# Altium footprint library Custom2.PcbLib: 99 footprints (part 2 of 7)
Each footprint in its own frame and in the unit in brackets; x right, y up, seen from the top. Pads: shape width x height; smd on the part's side, far side on the other; paste and mask are expansions set on the pad; w line width, h text height; cw(c..) or ccw(c..) is an arc to the next point about the centre after c.
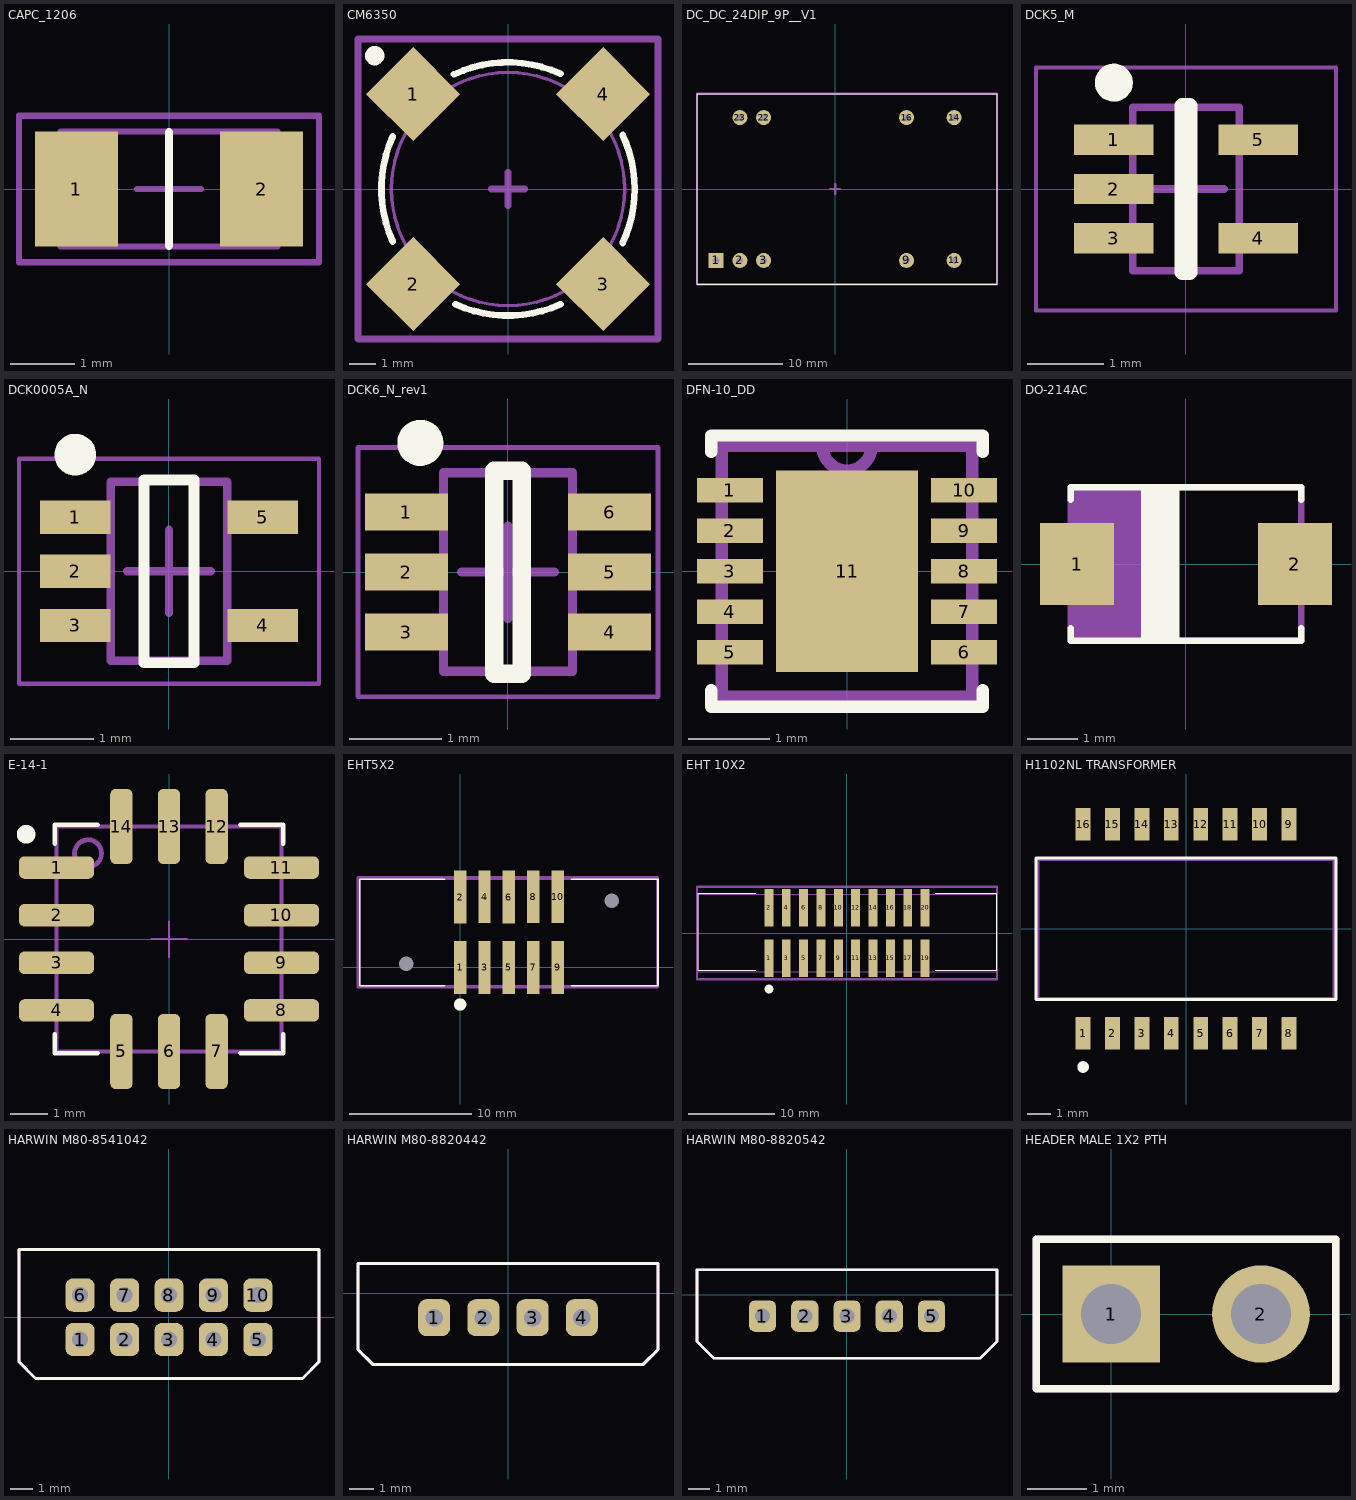
[diagram p1: the footprints below, top view; thin cyan lines are the x and y axes]

## CAPC_1206 [mm]
pads (2):
  rect 1.3x1.8 smd: 1(-1.45,0) 2(1.45,0)
Top Overlay:
  lines w0.127: 0,-0.889 0,0.889
Mechanical 13:
  lines w0.1: -1.7,-0.9 -1.7,0.9 1.7,0.9 1.7,-0.9 -1.7,-0.9
  text "'.Designator'" at -1.43,-0.602 h0.76
Mechanical 15:
  lines w0.1: -0.5,0 0.5,0 ; 0,-0.5 0,0.5 ; -2.35,-1.15 -2.35,1.15 2.35,1.15 2.35,-1.15 -2.35,-1.15
3D body: height 1.35, standoff 0, extent -1.7,-0.9 1.7,0.9

## CM6350 [mil]
pads (4):
  rect 100x100 smd rot 45 paste-4: 1(-142.5,142.5) 2(-142.5,-142.5) 3(142.5,-142.5) 4(142.5,142.5)
Top Overlay:
  circle w15: c-200,200 r7.07
  lines w10: -172.8,-78.99 cw(c0,0) -172.8,78.99 ; -80.9,171.92 cw(c0,0) 78.99,172.8 ; -78.99,-172.8 ccw(c0,0) 78.99,-172.8 ; 171.92,-80.9 ccw(c0,0) 171.92,80.9
Mechanical 13:
  circle w5: c0,0 r175
  circle w5: c-155,150 r10
  text "'.Designator'" at -55.34,-8.39 h30
Mechanical 15:
  lines w10: -25,0 25,0 ; 0,-25 0,25 ; -225,-225 -225,225 225,225 225,-225 -225,-225
3D body: height 204, standoff 4, extent -177.95,-174.86 172.05,174.88

## DC_DC_24DIP_9P__V1 [mm]
pads (9):
  rect 1.6x1.6 hole 0.711 paste-127 mask+0.05: 1(-12.7,-7.62)
  round 1.6 hole 0.711 paste-127 mask+0.05: 2(-10.16,-7.62) 3(-7.62,-7.62) 9(7.62,-7.62) 11(12.7,-7.62) 14(12.7,7.62) 16(7.62,7.62) 22(-7.62,7.62) 23(-10.16,7.62)
Top Overlay:
  lines w0.127: -14.73,-10.15 -14.73,10.16 17.27,10.16 17.27,-10.15 -14.73,-10.15
Mechanical 13:
  lines w0.15: -14.73,-10.15 -14.73,10.15 17.27,10.15 17.27,-10.15 -14.73,-10.15
  text "'.Designator'" at -3.175,-0.635 h0.76
Mechanical 15:
  lines w0.254: -0.508,0 0.508,0 ; 0,-0.508 0,0.508 ; -14.732,-10.16 -14.732,10.16 17.272,10.16 17.272,-10.16 -14.732,-10.16
3D body "ten8wi.stp": height 10.11, standoff -3.79, extent -14.7,-10.15 17.1,10.15

## DCK5_M [mm] "SOT23, 6-Leads, Body 2x1.3mm, Pitch 0.65mm, Lead Span 2.1mm, IPC Low Density"
height 1.1
pads (5):
  rect 1.05x0.4 smd: 1(-0.95,0.65) 2(-0.95,0) 3(-0.95,-0.65) 4(0.95,-0.65) 5(0.95,0.65)
Top Overlay:
  circle w0.25: c-0.95,1.4 r0.125
  lines w0.2: -0.05,-1.1 -0.05,1.1 0.05,1.1 0.05,-1.1 -0.05,-1.1
Mechanical 13:
  lines w0.1: -0.7,-1.075 0.7,-1.075 0.7,1.075 -0.7,1.075 -0.7,-1.075
Mechanical 15:
  lines w0.05: -1.975,-1.6 1.975,-1.6 1.975,1.6 -1.975,1.6 -1.975,-1.6
  lines w0.1: -0.5,0 0.5,0 ; 0,-0.5 0,0.5
3D body: height 1.1, standoff 0.2, extent -0.7,-1.075 0.7,1.075

## DCK0005A_N [mm]
pads (5):
  rect 0.85x0.4 smd: 1(-1.125,0.65) 2(-1.125,0) 3(-1.125,-0.65) 4(1.125,-0.65) 5(1.125,0.65)
Top Overlay:
  circle w0.25: c-1.125,1.4 r0.125
  lines w0.127: -0.3,-1.1 -0.3,1.1 0.3,1.1 0.3,-1.1 -0.3,-1.1
Mechanical 13:
  circle w0.127: c-1.27,0.635 r0.127
  lines w0.1: -0.7,-1.075 0.7,-1.075 0.7,1.075 -0.7,1.075 -0.7,-1.075
  text "'.Designator'" at -1.016,1.143 h0.76
Mechanical 15:
  lines w0.05: -1.8,-1.35 1.8,-1.35 1.8,1.35 -1.8,1.35 -1.8,-1.35
  lines w0.1: -0.5,0 0.5,0 ; 0,-0.5 0,0.5
3D body "DCK0005AakaMAA05A.stp": height 0.94, standoff -0.01, extent -1.14,-1 1.14,1

## DCK6_N_rev1 [mm] "SOT23, 6-Leads, Body 2x1.3mm, Pitch 0.65mm, Lead Span 2.1mm, IPC Medium Density"
height 1.1
pads (6):
  rect 0.9x0.4 smd: 1(-1.1,0.65) 2(-1.1,0) 3(-1.1,-0.65) 4(1.1,-0.65) 5(1.1,0) 6(1.1,0.65)
Top Overlay:
  circle w0.25: c-0.95,1.4 r0.125
  lines w0.2: -0.15,-1.1 -0.15,1.1 0.15,1.1 0.15,-1.1 -0.15,-1.1
Mechanical 13:
  lines w0.1: -0.7,-1.075 0.7,-1.075 0.7,1.075 -0.7,1.075 -0.7,-1.075
Mechanical 15:
  lines w0.05: -1.625,-1.35 1.625,-1.35 1.625,1.35 -1.625,1.35 -1.625,-1.35
  lines w0.1: -0.5,0 0.5,0 ; 0,-0.5 0,0.5
3D body: height 1.1, standoff 0.2, extent -0.7,-1.075 0.7,1.075

## DFN-10_DD [mil]
pads (11):
  rect 32x12 smd: 1(-57,39.37) 2(-57,19.68) 3(-57,0) 4(-57,-19.68) 5(-57,-39.37) 6(57,-39.37) 7(57,-19.68) 8(57,0) 9(57,19.68) 10(57,39.37)
  rect 69x98 smd: 11(0,0)
Top Overlay:
  lines w6: -66,-58 -66,-66 66,-66 66,-58 ; -66,58 -66,66 66,66 66,58
Top Paste:
  region: -34.5,49 -34.5,-49 34.5,-49 34.5,49
Mechanical 4:
  lines w6: -61,-61 -61,61 ; -61,-61 61,-61 ; -61,-61 -61,61 ; -61,-61 61,-61 ; -61,61 -12,61 ; -61,61 -12,61 ; -12,61 ccw(c0,61) 12,61 ; -12,61 ccw(c0,61) 12,61 ; -12,61 12,61 ; -12,61 12,61 ; 12,61 61,61 ; 12,61 61,61 ; 61,-61 61,61 ; 61,-61 61,61
3D body "NA__NA__LINEAR TECHNOLOGY__DFN-10_DD__NA--3DModel-Eagle-2523.STEP": height 32.1, standoff 0, extent -62.99,-60.99 63,61

## DO-214AC [mil]
pads (2):
  rect 58x64 smd: 1(-85,0) 2(85,0)
Top Overlay:
  rectangle: -35,-60 -5,60
  lines w5: -90,-50 -90,-60 90,-60 90,-50 ; -90,50 -90,60 90,60 90,50
Mechanical 13:
  rectangle: -90,-60 -35,60
  lines w5: -90,-60 90,-60 90,60 -90,60 -90,-60
  text "'.Designator'" at 56.15,17.09 h30
3D body "DO-214AC(SMA).STEP": height 90.6, standoff 0.6, extent -108,-55 108,55

## E-14-1 [mm]
pads (14):
  rrect50% 2x0.6 smd: 1(-3,1.905) 2(-3,0.635) 3(-3,-0.635) 4(-3,-1.905) 8(3,-1.905) 9(3,-0.635) 10(3,0.635) 11(3,1.905)
  rrect50% 0.6x2 smd: 5(-1.27,-3) 6(0,-3) 7(1.27,-3) 12(1.27,3) 13(0,3) 14(-1.27,3)
Top Overlay:
  circle w0.25: c-3.81,2.794 r0.125
  lines w0.127: -3.048,-2.54 -3.048,-3.048 -1.905,-3.048 ; -3.048,2.54 -3.048,3.048 -1.905,3.048 ; 1.905,-3.048 3.048,-3.048 3.048,-2.54 ; 1.905,3.048 3.048,3.048 3.048,2.54
Mechanical 13:
  circle w0.127: c-2.159,2.286 r0.359
  lines w0.1: -3,-3 -3,3 3,3 3,-3 -3,-3
  text "'.Designator'" at -1.905,-0.508 h0.76
Mechanical 15:
  lines w0.05: -0.475,0 0.475,0 ; 0,-0.475 0,0.475
3D body: height 2.21, standoff 2.18, extent -2.665,2.16 -2.159,2.667
3D body: height 2.2, standoff 1, extent -2.99,-2.98 2.99,3

## EHT5X2 [mm]
pads (12):
  round 0 hole 1.194 unplated: 0(-4.45,0.31) 0(12.45,5.466)
  rect 1.02x4.34 smd: 1(0,0) 2(0,5.776) 3(2,0) 4(2,5.8) 5(4,0) 6(4,5.776) 7(6,0) 8(6,5.8) 9(8,0) 10(8,5.8)
Top Overlay:
  circle w0.508: c0,-3.048 r0.254
  lines w0.127: -1.27,-1.524 -8.255,-1.524 -8.255,7.239 -1.27,7.239 ; 9.144,-1.524 16.256,-1.524 16.256,7.239 9.144,7.239
Mechanical 13:
  circle w0.381: c0,-0.889 r0.254
  lines w0.127: -8.255,-1.524 -8.255,7.239 16.256,7.239 16.256,-1.524 -8.255,-1.524
  text "'.Designator'" at 0.381,2.413 h0.76
Mechanical 15:
  lines w0.254: -8.4,-1.6 16.2,-1.6 16.2,7.4 -8.4,7.4 -8.4,-1.6
3D body "Samtec-EHT-105-01-L-D-SM-LC.STEP": height 12.59, standoff -1.13, extent -8.217,-1.592 16.203,7.298

## EHT 10X2 [mm]
pads (20):
  rect 1.02x4.34 smd: 1(-9,-2.9) 2(-9,2.9) 3(-7,-2.9) 4(-7,2.9) 5(-5,-2.9) 6(-5,2.9) 7(-3,-2.9) 8(-3,2.9) 9(-1,-2.9) 10(-1,2.9) 11(1,-2.9) 12(1,2.9) 13(3,-2.9) 14(3,2.9) 15(5,-2.9) 16(5,2.9) 17(7,-2.9) 18(7,2.9) 19(9,-2.9) 20(9,2.9)
Top Overlay:
  circle w0.508: c-9,-6.456 r0.254
  lines w0.127: -10.541,-4.318 -17.145,-4.318 -17.145,4.572 -10.541,4.572 ; 10.16,-4.318 17.272,-4.318 17.272,4.572 10.16,4.572
Mechanical 13:
  circle w0.381: c-9.017,-3.683 r0.254
  lines w0.127: -17.145,-4.445 -17.145,4.445 17.272,4.445 17.272,-4.445 -17.145,-4.445
  text "'.Designator'" at 1.702,0.381 h0.76
Mechanical 15:
  lines w0.254: -17.3,-5.334 17.3,-5.334 17.3,5.334 -17.3,5.334 -17.3,-5.334
3D body "EHT-110-01-S-D-SM.stp": height 12.33, standoff 0.01, extent -17.192,-4.445 17.193,4.445
3D body: height 0.25, standoff 0, extent -12.4,1.7 -12.4,1.7

## H1102NL TRANSFORMER [mm]
pads (16):
  rect 0.64x1.4 smd: 1(-4.445,-4.51) 2(-3.175,-4.51) 3(-1.905,-4.51) 4(-0.635,-4.51) 5(0.635,-4.51) 6(1.905,-4.51) 7(3.175,-4.51) 8(4.445,-4.51) 9(4.445,4.51) 10(3.175,4.51) 11(1.905,4.51) 12(0.635,4.51) 13(-0.635,4.51) 14(-1.905,4.51) 15(-3.175,4.51) 16(-4.445,4.51)
Top Overlay:
  circle w0.25: c-4.443,-5.969 r0.125
  lines w0.127: -6.477,-3.048 6.477,-3.048 6.477,3.048 -6.477,3.048 -6.477,-3.048
Mechanical 13:
  lines w0.127: -6.4,-3 6.4,-3 6.4,3 -6.4,3 -6.4,-3
3D body: height 6.02, standoff 5.99, extent -5.84,-2.666 -5.334,-2.159
3D body: height 6, standoff 0, extent -6.4,-3 6.4,3

## HARWIN M80-8541042 [mm]
pads (10):
  rrect50% 1.3x1.5 hole 0.711: 1(-4,-1) 2(-2,-1) 3(0,-1) 4(2,-1) 5(4,-1) 6(-4,1) 7(-2,1) 8(0,1) 9(2,1) 10(4,1)
Top Overlay:
  lines w0.127: -6.75,-2 -6,-2.75 6,-2.75 6.75,-2 6.75,3.048 -6.75,3.048 -6.75,-2
Mechanical 13:
  lines w0.127: -6.75,-2 -6,-2.75 6,-2.75 6.75,-2 6.75,3.048 -6.75,3.048 -6.75,-2
  text "'.Designator'" at -3.81,-0.508 h0.76
3D body "m80-8541042_asm.stp": height 5.4, standoff -3.35, extent -6.75,-2.775 6.75,3.075

## HARWIN M80-8820442 [mm] "CONN HEADER VERT 4POS 2MM"
pads (4):
  rrect50% 1.3x1.5 hole 0.711: 1(-3,-1) 2(-1,-1) 3(1,-1) 4(3,-1)
Top Overlay:
  lines w0.127: -6.1,-2.3 -6.1,1.2 6.1,1.2 6.1,-2.3 5.5,-2.9 -5.5,-2.9 -6.1,-2.3
Mechanical 13:
  lines w0.127: -6.1,-2.3 -5.5,-2.9 5.5,-2.9 6.1,-2.3 6.1,1.2 -6.1,1.2 -6.1,-2.3
  text "'.Designator'" at -3.81,-0.508 h0.76
3D body "m80-8820442_asm.stp": height 8.35, standoff -3.35, extent -5.95,-2.775 5.95,1.075

## HARWIN M80-8820542 [mm] "CONN HEADER VERT 5POS 2MM"
pads (5):
  rrect50% 1.3x1.5 hole 0.711: 1(-4,-1) 2(-2,-1) 3(0,-1) 4(2,-1) 5(4,-1)
Top Overlay:
  lines w0.127: -7.1,-2.2 -6.3,-3 6.3,-3 7.1,-2.2 7.1,1.2 -7.1,1.2 -7.1,-2.2
Mechanical 13:
  lines w0.127: -7.1,-2.2 -6.3,-3 6.3,-3 7.1,-2.2 7.1,1.2 -7.1,1.2 -7.1,-2.2
  text "'.Designator'" at -3.81,-0.508 h0.76
3D body "m80-8820542_asm.stp": height 8.06, standoff -3.64, extent -6.95,-2.775 6.95,1.075

## HEADER MALE 1X2 PTH [mil]
pads (2):
  rect 65x65 hole 40: 1(0,0)
  round 65 hole 40: 2(100,0)
Top Overlay:
  lines w5: -50,-50 150,-50 150,50 -50,50 -50,-50
Mechanical 13:
  lines w5: -50,-50 -50,50 150,50 150,-50 -50,-50
  text "'.Designator'" at 31,31 h30
3D body: height 50, standoff 0, extent -50,-50 150,50
3D body: height 300, standoff -100, extent -15,-15 15,15
3D body: height 300, standoff -100, extent 85,-15 115,15